# Altium footprint library SEMICONDUCTORS.PcbLib: 91 footprints (part 4 of 6)
Each footprint in its own frame and in the unit in brackets; x right, y up, seen from the top. Pads: shape width x height; smd on the part's side, far side on the other; paste and mask are expansions set on the pad; w line width, h text height; cw(c..) or ccw(c..) is an arc to the next point about the centre after c.
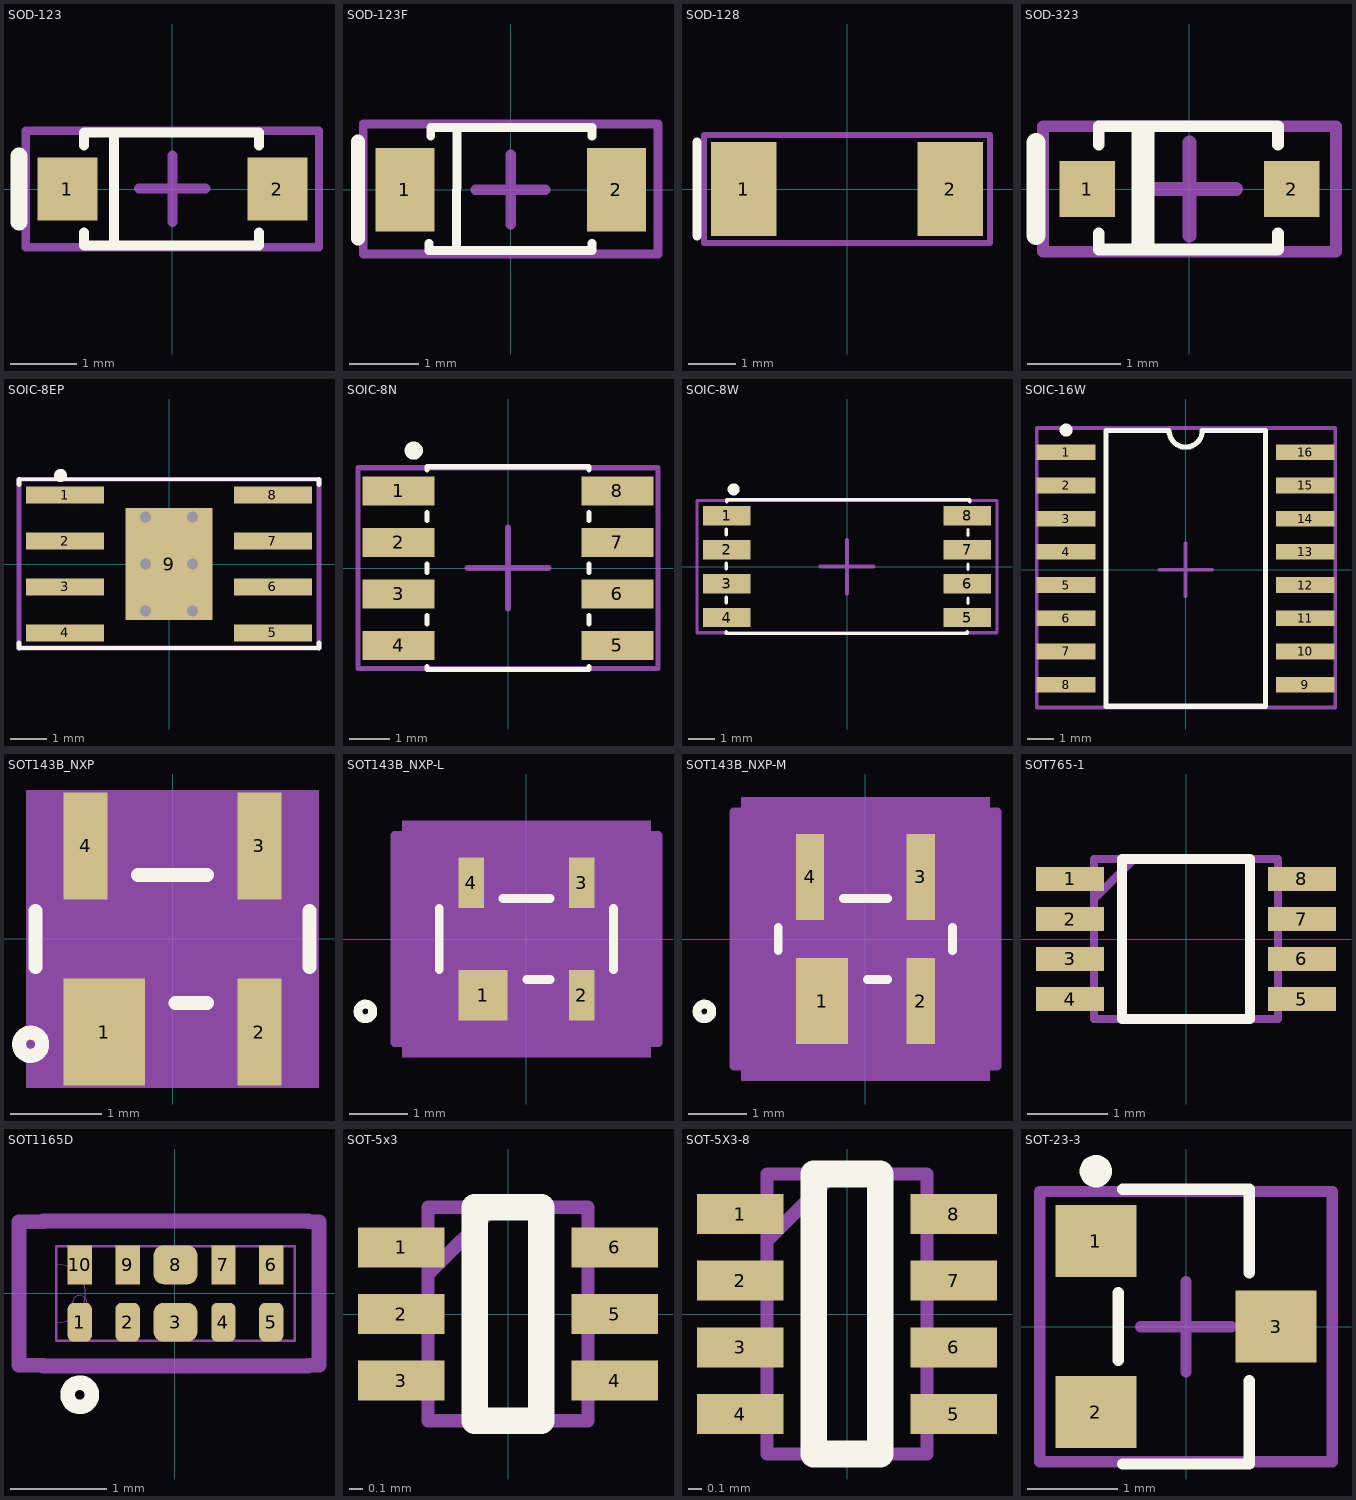
[diagram p3: the footprints below, top view; thin cyan lines are the x and y axes]

## SOD-123 [mm]
pads (2):
  rect 0.9x0.95 smd: 1(-1.575,0) 2(1.575,0)
Top Overlay:
  lines w0.15: -1.325,-0.65 -1.325,-0.85 1.3,-0.85 1.3,-0.65 ; -1.325,0.65 -1.325,0.825 ; -1.325,0.85 1.3,0.85 1.3,0.65 ; -0.875,-0.775 -0.875,0.8
  lines w0.25: -2.3,-0.5 -2.3,0.5
Top Assembly:
  lines w0.127: -2.2,-0.875 -2.2,0.875 2.2,0.875 2.2,-0.875 -2.2,-0.875
  text ".Designator" at -1.475,-0.35 h0.8
Top Component Center:
  lines w0.15: -0.5,0.004 0.5,0.004 ; 0,-0.496 0,0.504
3D body "SOD-123.STEP": height 1.43, standoff -0.02, extent -1.825,-0.775 1.825,0.775

## SOD-123F [mm]
pads (2):
  rect 0.85x1.2 smd: 1(-1.525,0) 2(1.525,0)
Top Overlay:
  lines w0.127: -1.175,-0.775 -1.175,-0.875 1.175,-0.875 1.175,-0.775 ; -1.15,0.775 -1.15,0.9 1.175,0.9 1.175,0.775 ; -0.78,-0.875 -0.774,0.9
  lines w0.2: -2.2,-0.7 -2.2,0.7
Top Assembly:
  lines w0.127: -2.125,-0.925 2.125,-0.925 2.125,0.95 -2.125,0.95 -2.125,-0.925
  text ".Designator" at -1.4,-0.45 h0.8
Top Component Center:
  lines w0.15: -0.5,0.004 0.5,0.004 ; 0,-0.496 0,0.504
3D body "SOD-123F.STEP": height 1.12, standoff 0.02, extent -1.75,-0.846 1.75,0.854

## SOD-128 [mm]
pads (2):
  rect 1.4x2 smd: 1(-2.2,0) 2(2.2,0)
Top Overlay:
  lines w0.2: -3.2,-1 -3.2,1
Top Assembly:
  lines w0.127: -3.05,-1.15 3.05,-1.15 3.05,1.15 -3.05,1.15 -3.05,-1.15
  text ".Designator" at -1.175,-0.325 h0.8
3D body "SOD-128.step": height 1.02, standoff 0, extent -2.4,-1.25 2.4,1.25

## SOD-323 [mm]
pads (2):
  rect 0.6x0.6 smd: 1(-1.1,0) 2(1.1,0)
Top Overlay:
  lines w0.127: -0.975,-0.475 -0.975,-0.65 0.95,-0.65 0.95,-0.475 ; -0.975,0.475 -0.975,0.675 0.95,0.675 0.95,0.475
  lines w0.2: -1.65,-0.5 -1.65,0.5
  lines w0.25: -0.5,-0.575 -0.5,0.6
Top Assembly:
  lines w0.127: -1.575,-0.675 1.575,-0.675 1.575,0.675 -1.575,0.675 -1.575,-0.675
  text ".Designator" at -1.175,-0.375 h0.8
Top Component Center:
  lines w0.15: -0.5,0 0.5,0 ; 0,-0.5 0,0.5
3D body "SOD-323.step": height 1.1, standoff 0, extent -1.3,-0.675 1.3,0.675

## SOIC-8EP [mm] "8-SOIC (0.154\", 3.90mm Width) Exposed Pad"
height 1.7
pads (9):
  rect 2.15x0.47 smd: 1(-2.875,1.905) 2(-2.875,0.635) 3(-2.875,-0.635) 4(-2.875,-1.905) 5(2.875,-1.905) 6(2.875,-0.635) 7(2.875,0.635) 8(2.875,1.905)
  rect 2.4x3.1 smd paste-0.4: 9(0,0)
via -0.65,1.3 diameter 0.505 hole 0.305
via 0.65,1.3 diameter 0.505 hole 0.305
via 0.65,0 diameter 0.505 hole 0.305
via -0.65,0 diameter 0.505 hole 0.305
via -0.65,-1.3 diameter 0.505 hole 0.305
via 0.65,-1.3 diameter 0.505 hole 0.305
Top Overlay:
  circle w0.2: c-3,2.45 r0.08
  lines w0.1: -4.15,-2.325 4.15,-2.325 ; -4.15,2.35 4.15,2.35
  lines w0.127: -4.15,-2.325 -4.15,-2.175 ; -4.15,2.2 -4.15,2.35 ; 4.15,-2.325 4.15,-2.175 ; 4.15,2.2 4.15,2.35
Top Assembly:
  lines w0.127: -4.15,-2.325 -4.15,2.35 4.15,2.35 4.15,-2.325 -4.15,-2.325
  text ".Designator" at -2,-0.375 h1.2
Top Component Center:
  lines w0.15: -0.5,0.004 0.5,0.004 ; 0,-0.496 0,0.504
3D body "SOIC-8EP.STEP": height 1.73, standoff 0.03, extent -3,-2.45 3,2.45

## SOIC-8N [mm]
pads (8):
  rect 1.78x0.72 smd: 1(-2.7,1.905) 2(-2.7,0.635) 3(-2.7,-0.635) 4(-2.7,-1.905) 5(2.7,-1.905) 6(2.7,-0.635) 7(2.7,0.635) 8(2.7,1.905)
Top Overlay:
  circle w0.25: c-2.325,2.9 r0.1
  lines w0.127: -2,-2.425 -2,-2.5 2,-2.5 2,-2.425 ; -2,-1.375 -2,-1.175 ; -2,-0.1 -2,0.1 ; -2,1.175 -2,1.375 ; -2,2.425 -2,2.5 2,2.5 2,2.425 ; 2,-1.375 2,-1.175 ; 2,-0.1 2,0.1 ; 2,1.175 2,1.375
Top Assembly:
  lines w0.127: -3.7,-2.475 3.7,-2.475 3.7,2.475 -3.7,2.475 -3.7,-2.475
  text ".Designator" at 0.55,-1.9 h1.5
Top Component Center:
  lines w0.15: -1,0 1,0 ; 0,-1 0,1
3D body "SOIC-8.step": height 1.75, standoff 0, extent -3,-2.45 3,2.45

## SOIC-8W [mm]
pads (8):
  rect 1.78x0.72 smd: 1(-4.5,1.905) 2(-4.5,0.635) 3(-4.5,-0.635) 4(-4.5,-1.905) 5(4.5,-1.905) 6(4.5,-0.635) 7(4.5,0.635) 8(4.5,1.905)
Top Overlay:
  circle w0.25: c-4.242,2.896 r0.1
  lines w0.127: -4.521,-2.425 -4.521,-2.5 4.5,-2.5 4.5,-2.425 ; -4.519,-1.35 -4.519,-1.15 ; -4.519,-0.075 -4.519,0.125 ; -4.519,1.2 -4.519,1.4 ; -4.5,2.425 -4.5,2.5 4.597,2.5 4.597,2.425 ; 4.528,-1.375 4.528,-1.175 ; 4.528,-0.1 4.528,0.1 ; 4.528,1.175 4.528,1.375
Top Assembly:
  lines w0.127: -5.613,-2.475 -5.613,2.475 5.613,2.475 5.613,-2.475 -5.613,-2.475
  text ".Designator" at 0.55,-1.9 h1.5
Top Component Center:
  lines w0.15: -1,0 1,0 ; 0,-1 0,1
3D body: height 2.5, standoff 0, extent -4.521,-2.261 4.575,2.261

## SOIC-16W [mm]
pads (16):
  rect 2.25x0.6 smd paste-0.051: 1(-4.575,4.495) 2(-4.575,3.225) 3(-4.575,1.955) 4(-4.575,0.685) 5(-4.575,-0.585) 6(-4.575,-1.855) 7(-4.575,-3.125) 8(-4.575,-4.395) 9(4.575,-4.395) 10(4.575,-3.125) 11(4.575,-1.855) 12(4.575,-0.585) 13(4.575,0.685) 14(4.575,1.955) 15(4.575,3.225) 16(4.575,4.495)
Top Overlay:
  circle w0.25: c-4.575,5.345 r0.125
  lines w0.2: -3.05,-5.225 3.05,-5.225 3.05,5.325 0.635,5.325 cw(c0,5.325) -0.635,5.325 -3.05,5.325 -3.05,-5.225
Top Assembly:
  lines w0.15: -5.7,-5.275 -5.7,5.425 5.725,5.425 5.725,-5.275 -5.7,-5.275
  text ".Designator" at 0.5,-3.525 h1.5
Top Component Center:
  lines w0.15: -1,0 1,0 ; 0,-1 0,1
3D body "SOIC-16W.step": height 2.62, standoff -0.03, extent -5.315,-5.25 5.315,5.25

## SOT143B_NXP [mil]
pads (4):
  rect 35x46 smd paste+0 mask+0: 1(-29.4,-40)
  rect 19x46 smd paste+0 mask+0: 2(37.4,-40) 3(37.4,40) 4(-37.4,40)
Top Overlay:
  circle w6: c-61.02,-45.28 r5
  lines w6: -59,-11.98 -59,11.98 ; -14.8,27.5 14.8,27.5 ; 1.2,-27.5 14.8,-27.5 ; 59,-11.98 59,11.98
Bottom Component Center:
  region: -62.99,63.98 62.99,63.98 62.99,-63.98 -62.99,-63.98
Mechanical 13:
  circle w0: c-49,-17.5 r5
  lines w1: -59,-27.5 -59,27.5 59,27.5 59,-27.5 -59,-27.5 ; -46.9,-49 -11.9,-49 -11.9,-27.5 -46.9,-27.5 -46.9,-49 ; -46.9,27.5 -46.9,49 -27.9,49 -27.9,27.5 -46.9,27.5 ; 27.9,-49 46.9,-49 46.9,-27.5 27.9,-27.5 27.9,-49 ; 27.9,27.5 27.9,49 46.9,49 46.9,27.5 27.9,27.5
Mechanical 15:
  region: -62.99,-63.98 -62.99,63.98 62.99,63.98 62.99,-63.98
  lines w6: -60.04,-61.02 -60.04,61.02 60.04,61.02 60.04,-61.02 -60.04,-61.02
3D body "SOT143B_NXP.step": height 43.11, standoff 0, extent -59.02,-49.02 59.02,49.02

## SOT143B_NXP-L [mil]
pads (4):
  rect 33x34 smd paste+0 mask+0: 1(-29.4,-38)
  rect 17x34 smd paste+0 mask+0: 2(37.4,-38) 3(37.4,38) 4(-37.4,38)
Top Overlay:
  circle w6: c-109,-49 r5
  lines w6: -59,-20.8 -59,20.8 ; -15.8,27.5 15.8,27.5 ; 0.2,-27.5 15.8,-27.5 ; 59,-20.8 59,20.8
Bottom Component Center:
  region: -84,80 84,80 84,-80 -84,-80
Mechanical 13:
  circle w0: c-49,-17.5 r5
  lines w1: -59,-27.5 59,-27.5 59,27.5 -59,27.5 -59,-27.5 ; -46.9,-49 -46.9,-27.5 -11.9,-27.5 -11.9,-49 -46.9,-49 ; -46.9,27.5 -27.9,27.5 -27.9,49 -46.9,49 -46.9,27.5 ; 27.9,-49 27.9,-27.5 46.9,-27.5 46.9,-49 27.9,-49 ; 27.9,27.5 46.9,27.5 46.9,49 27.9,49 27.9,27.5
Mechanical 15:
  region: -89,-70 -89,70 89,70 89,-70
  lines w6: -89,-70 89,-70 89,70 -89,70 -89,-70
3D body "SOT143B_NXP.step": height 43.11, standoff 0, extent -59.02,-49.02 59.02,49.02

## SOT143B_NXP-M [mil]
pads (4):
  rect 35x58 smd paste+0 mask+0: 1(-29.4,-42)
  rect 19x58 smd paste+0 mask+0: 2(37.4,-42) 3(37.4,42) 4(-37.4,42)
Top Overlay:
  circle w6: c-109,-49 r5
  lines w6: -59,-7.98 -59,7.98 ; -14.8,27.5 14.8,27.5 ; 1.2,-27.5 14.8,-27.5 ; 59,-7.98 59,7.98
Bottom Component Center:
  region: -84,96 84,96 84,-96 -84,-96
Mechanical 13:
  circle w0: c-49,-17.5 r5
  lines w1: -59,-27.5 59,-27.5 59,27.5 -59,27.5 -59,-27.5 ; -46.9,-49 -46.9,-27.5 -11.9,-27.5 -11.9,-49 -46.9,-49 ; -46.9,27.5 -27.9,27.5 -27.9,49 -46.9,49 -46.9,27.5 ; 27.9,-49 27.9,-27.5 46.9,-27.5 46.9,-49 27.9,-49 ; 27.9,27.5 46.9,27.5 46.9,49 27.9,49 27.9,27.5
Mechanical 15:
  region: -89,-86 -89,86 89,86 89,-86
  lines w6: -89,-86 89,-86 89,86 -89,86 -89,-86
3D body "SOT143B_NXP.step": height 43.11, standoff 0, extent -59.02,-49.02 59.02,49.02

## SOT765-1 [mm]
pads (8):
  rect 0.85x0.3 smd: 1(-1.45,0.75) 2(-1.45,0.25) 3(-1.45,-0.25) 4(-1.45,-0.75) 5(1.45,-0.75) 6(1.45,-0.25) 7(1.45,0.25) 8(1.45,0.75)
Top Overlay:
  lines w0.127: -0.8,-1 -0.8,1 0.8,1 0.8,-1 -0.8,-1
Mechanical 13:
  lines w0.1: -1.15,0.5 -0.65,1 ; -1.15,-1 -1.15,1 1.15,1 1.15,-1 -1.15,-1
3D body "NCA9306DCH.stp": height 0.8, standoff 0, extent -1.559,-1 1.554,1

## SOT1165D [mil] "TVS ARRAY - PESD4USB5B-TTS"
height 29.53
pads (10):
  rrect50% 10x16 smd paste-0.39 mask+0: 1(-39,-12) 2(-19.31,-12) 4(20.07,-12) 5(39.76,-12)
  rrect50% 18x16 smd paste-1.97 mask+0: 3(0.38,-12) 8(0.38,11.62)
  rect 10x16 smd paste-0.39 mask+0: 6(39.76,11.62) 7(20.07,11.62) 9(-19.31,11.62) 10(-39,11.62)
Top Overlay:
  circle w6: c-39,-41.84 r5
Top Assembly:
  text ".Designator" at -61,-16 h31.5
Mechanical 13:
  circle w0: c-39,-4 r3
  lines w0: -48.62,-12.19 ccw(c-48.62,-0.19) -48.62,11.81
  lines w1: -48.62,-19.69 49.38,-19.69 49.38,19.31 -48.62,19.31 -48.62,-19.69
Mechanical 15:
  lines w6: -64,-29.69 -64,29.31 -54,29.31 -54,29.62 54.76,29.62 54.76,29.31 59.38,29.31 59.38,-29.69 54.76,-29.69 54.76,-30 -54,-30 -54,-29.69 -64,-29.69
3D body "DFN_5U-TTSX_NEX.step": height 32.09, standoff 0, extent -48.64,-19.67 49.39,19.3

## SOT-5x3 [mm]
pads (6):
  rect 0.65x0.3 smd: 1(-0.8,0.5) 2(-0.8,0) 3(-0.8,-0.5) 4(0.8,-0.5) 5(0.8,0) 6(0.8,0.5)
Top Overlay:
  lines w0.2: -0.25,-0.8 -0.25,0.8 0.25,0.8 0.25,-0.8 -0.25,-0.8
Mechanical 13:
  lines w0.1: -0.6,0.3 -0.1,0.8 ; -0.6,-0.8 -0.6,0.8 0.6,0.8 0.6,-0.8 -0.6,-0.8
3D body "TPS61023DRLT.stp": height 0.6, standoff 0, extent -0.8,-0.8 0.8,0.8

## SOT-5X3-8 [mm]
pads (8):
  rect 0.65x0.3 smd: 1(-0.8,0.75) 2(-0.8,0.25) 3(-0.8,-0.25) 4(-0.8,-0.75) 5(0.8,-0.75) 6(0.8,-0.25) 7(0.8,0.25) 8(0.8,0.75)
Top Overlay:
  lines w0.2: -0.25,-1.05 0.25,-1.05 0.25,1.05 -0.25,1.05 -0.25,-1.05
Mechanical 13:
  lines w0.1: -0.6,0.55 -0.1,1.05 ; -0.6,-1.05 0.6,-1.05 0.6,1.05 -0.6,1.05 -0.6,-1.05
3D body "TPS2116DRLR.stp": height 0.6, standoff 0, extent -0.8,-1.05 0.8,1.05

## SOT-23-3 [mm]
pads (3):
  rect 0.9x0.8 smd: 1(-1,0.95) 2(-1,-0.95) 3(1,0)
Top Overlay:
  circle w0.2: c-1,1.725 r0.08
  lines w0.127: -0.75,-0.375 -0.75,0.375 ; -0.7,-1.525 0.7,-1.525 0.7,-0.6 ; -0.7,1.525 0.7,1.525 0.7,0.6
Top Assembly:
  lines w0.127: -1.625,-1.5 1.625,-1.5 1.625,1.5 -1.625,1.5 -1.625,-1.5
  text ".Designator" at -1.45,-0.45 h1
Top Component Center:
  lines w0.127: -0.5,0 0.5,0 ; 0,-0.5 0,0.5
3D body "SOT-23-3.stp": height 1, standoff 0, extent -1.15,-1.45 1.15,1.45